# Altium integrated library Mastermind.IntLib: 985 symbols (part 3 of 6) (continued)
## MODULE-TMC5160-BOB
designator U?
This board was developed for applications and installations where space is premium and projects are made as permanent set ups. Small, available in 3.3 V and 5 V versions, powered by ATmega328P.; MP: Arduino Pro Mini; MF: Arduino; Price: None; Availability: Not in stock; Package: None; Value: *; SnapEDA_Link: https://www.snapeda.com/parts/Arduino%20Pro%20Mini/Arduino/view-part/?ref=snap; Check_prices: https://www.snapeda.com/parts/Arduino%20Pro%20Mini/Arduino/view-part/?ref=eda
footprint Module_tmc5160_bob
pins: 1 VCC_IO (power), 2 GND (power), 3 CSN-CFG3, 4 SCK_SFG2, 5 SDI_CFG1, 6 SDO_CFG0, 7 GND, 8 CLK, 9 DRV_ENN, 10 REFL_STEP, 11 REFR_DIR, 12 ENCN_DCO_CFG6, 13 ENCB_DGEN_CFG4, 14 ENCA_DCIN_CFG5, 15 DIAG0_SWN, 16 GND, 17 BMA1, 18 BMA2, 19 BMB1, 20 BMB2, 21 GND (power), 22 VS (power)

## MODULE-XL4015
designator U?
footprint MODULE-XL4015
pins: 1 IN, 2 GND, 3 OUT, 4 GND
text: XL4015-ADJ

## MOSFET-2N70002
designator Q?, comment 2N7002  (value not drawn)
N-Channel Mosfet 2N7002E - 60V 260mA SOT23
footprint SOT23
pins: 1 G "Gate", 2 S "Drain", 3 D "Source"

## MOSFET-AO3407_SOT23
designator Q?
footprint SOT23
pins: 1 G, 2 S, 3 D

## MOSFET-AO4884
designator U?, comment AO4884  (value not drawn)
Dual N-Channel 40V 10A  27mΩ  SOP8; Manufacturer: HXY MOSFET(华轩阳电子); Manufacturer Part: AO4884-HXY; Contributor: lcsc; Supplier: LCSC; Supplier Part: C5148656; JLCPCB Part Class: Extended Part; spicePre: U; spiceSymbolName: AO4884_C5148656
footprint SOIC-8E (SOIC, 8-Leads, Body 4.90x3.90mm, Pitch 1.27mm, IPC Medium Density); pin to pad 5>5+6 7>7+8
part A pins: 1 S "Drain", 2 G "Gate", 7 D "Source"
part B pins: 3 S "Drain", 4 G "Gate", 5 D "Source"

## MOSFET-AON7212
designator Q?, comment AON7212
N Channel Mosfet 30V 40A dfn-8
footprint POWERDI3333-8_L3.3-W3.3-P0.65-BL
pins: 1 G, 2 S, 3 D

## MOSFET-BSC886N03LSG
designator U1, comment BSC886N03LSG
Manufacturer: Infineon(英飞凌); Contributor: lcsc; Supplier: LCSC; Supplier Part: C3275891; Manufacturer Part: BSC886N03LSG; spicePre: U; spiceSymbolName: BSC886N03LSG
footprint PG-TDSON-8_L5.0-W6.0-P1.27-BL-EP
pins: 1 S, 2 S, 3 S, 4 G, 5 D, 6 D, 7 D, 8 D

## MOSFET-BSS138
designator Q?, comment BSS138
N Channel Mosfet
footprint SOT23
pins: 1 "Gate", 2 "Source", 3 "Drain"

## MOSFET-D403-PChannel
designator Q?
footprint TO252
pins: 1 G, 2 S, 3 D

## MOSFET-DMP2305u-7
designator Q?, comment DMP2305u-7
P Channel Mosfet
footprint SOT23
pins: 1 "Gate", 2 "Source", 3 "Drain"

## MOSFET-DMP4025SFG
designator Q?, comment DMP2305u-7
P Channel Mosfet
footprint POWERDI3333-8_L3.3-W3.3-P0.65-BL
pins: 1 G, 2 S, 3 D

## MOSFET-HYG200P10LR1B_P
designator Q?, comment HYG200P10LR1B
P-Channel MOSFET,  100V 80A Externally Terminated Substrate; Published: 24-Mar-1999; LatestRevisionDate: 29-May-2009; LatestRevisionNote: IPC-7351 Footprint Added.; PackageVersion: Sep-2000; PackageReference: SOT-343; Publisher: Altium Limited; PackageDescription: 4-Pin SOT-343 Package 1.3 mm Pitch, 2.1 mm Lead Span
footprint TO-263-2
pins: 1 G, 2 D, 3 S

## MOSFET-IPB072N15N3G
designator Q?, comment IPB072N15N3G
N-Channel MOSFET,  100V 80A  7.2mΩ; Published: 24-Mar-1999; LatestRevisionDate: 29-May-2009; LatestRevisionNote: IPC-7351 Footprint Added.; PackageVersion: Sep-2000; PackageReference: SOT-343; Publisher: Altium Limited; PackageDescription: 4-Pin SOT-343 Package 1.3 mm Pitch, 2.1 mm Lead Span
footprint TO-263-2
pins: 1 G, 2 D, 3 S

## MOSFET-IRF520
designator Q?, comment MOSFET-N4
N-Channel MOSFET; Published: 24-Mar-1999; LatestRevisionDate: 29-May-2009; LatestRevisionNote: IPC-7351 Footprint Added.; PackageVersion: Sep-2000; PackageReference: SOT-343; Publisher: Altium Limited; PackageDescription: 4-Pin SOT-343 Package 1.3 mm Pitch, 2.1 mm Lead Span
footprint TO220
pins: 1 G, 2 D, 3 S

## MOSFET-IRFP250PBF
designator Q?, comment IRFP250PBF
N-Channel; Manufacturer: VISHAY(威世); Add into BOM: yes; Drain Source On Resistance (RDS(on)@Vgs,Id): 85mΩ@10V,18A; Gate Threshold Voltage (Vgs(th)@Id): 4V@250uA; Total Gate Charge (Qg@Vgs): 140nC@10V; Input Capacitance (Ciss@Vds): 2.8nF@25V; Symbol: IRFP250PBF; Device: IRFP250PBF; Supplier: LCSC; Manufacturer Part: IRFP250PBF; Supplier Part: C11749; JLCPCB Part Class: Extended Part; LCSC Part Name: N沟道 耐压:200V 电流:30A; Supplier Footprint: TO-247AC-3; Datasheet: https://atta.szlcsc.com/upload/public/pdf/source/20130302/1457706596399.pdf; Convert to PCB: yes; Operating Temperature: -55℃~+150℃@(Tj); Name: IRFP250PBF
footprint TO-247AC-3_L15.8-W5.0-P5.46-L
pins: 1 G, 2 D, 3 S

## MOSFET-LR7807Z/15N10
designator Q?
P-
footprint TO252
footprint TO254P-3N
pins: 1 G, 2 D, 3 S

## MOSFET-MPT045N08S
designator Q?, comment MPT045N08S
N-Channel MOSFET,  85V 138A  4.4mΩ; Published: 24-Mar-1999; LatestRevisionDate: 29-May-2009; LatestRevisionNote: IPC-7351 Footprint Added.; PackageVersion: Sep-2000; PackageReference: SOT-343; Publisher: Altium Limited; PackageDescription: 4-Pin SOT-343 Package 1.3 mm Pitch, 2.1 mm Lead Span
footprint TO-263-2
pins: 1 G, 2 D, 3 S

## MOSFET-N
designator Q?, comment MOSFET-N4
N-Channel MOSFET; Published: 24-Mar-1999; LatestRevisionDate: 29-May-2009; LatestRevisionNote: IPC-7351 Footprint Added.; PackageVersion: Sep-2000; PackageReference: SOT-343; Publisher: Altium Limited; PackageDescription: 4-Pin SOT-343 Package 1.3 mm Pitch, 2.1 mm Lead Span
pins: 1 G, 1 G "Gate", 1 G, 1 G, 1 G "Gate", 2 D, 2 S "Drain", 2 S, 2 D, 2 S "Drain", 3 U, 3 D "Source", 3 D, 3 D "Source", 4 S, 4 S

## MOSFET-N4
designator Q?
N-Channel MOSFET, Externally Terminated Substrate; Published: 24-Mar-1999; LatestRevisionDate: 29-May-2009; LatestRevisionNote: IPC-7351 Footprint Added.; PackageVersion: Sep-2000; PackageReference: SOT-343; Publisher: Altium Limited; PackageDescription: 4-Pin SOT-343 Package 1.3 mm Pitch, 2.1 mm Lead Span
footprint SOT-343_N (SOT343, 4-Leads, Body 2x1.3 mm, Pitch 1.3mm, Lead Span 2.1mm, IPC Medium Density)
footprint SOT-343_L (SOT343, 4-Leads, Body 2x1.3 mm, Pitch 1.3mm, Lead Span 2.1mm, IPC High Density)
footprint SOT-343_M (SOT343, 4-Leads, Body 2x1.3 mm, Pitch 1.3mm, Lead Span 2.1mm, IPC Low Density)
simulation model NMOS (MOSFET-N)
pins: 1 G, 2 D, 3 U, 4 S

## MOSFET-NCE60P50K_P
designator Q?, comment NCE60P50K
P-Channel MOSFET,  60V 50A; Published: 24-Mar-1999; LatestRevisionDate: 29-May-2009; LatestRevisionNote: IPC-7351 Footprint Added.; PackageVersion: Sep-2000; PackageReference: SOT-343; Publisher: Altium Limited; PackageDescription: 4-Pin SOT-343 Package 1.3 mm Pitch, 2.1 mm Lead Span
footprint TO252
pins: 1 G, 2 S, 3 D

## MOSFET-NGDS_TO220V
designator Q?, comment N-Channel Mosfet 2N7002E - 60V 260mA SOT23 [Digikey: 2N7002ET1GOSTR-ND] - REEL  BSH103 - 30V 850mA SOT23 [Digikey: 568-5013-1-ND]
footprint TO220V
pins: 1 G, 2 D, 3 S

## MOSFET-NREFLOW
designator Q?, comment N-Channel Mosfet 2N7002E - 60V 260mA SOT23 [Digikey: 2N7002ET1GOSTR-ND] - REEL  BSH103 - 30V 850mA SOT23 [Digikey: 568-5013-1-ND]
footprint SOT23
pins: 1 G, 2 S, 3 D

## MOSFET-NTZD3152PT1G
designator Q?, comment NTZD3152PT1G
Dual P-Channel MOSFET 20V 1A; Manufacturer: TECH PUBLIC(台舟); Contributor: lcsc; Supplier: LCSC; Supplier Part: C7472928; Manufacturer Part: NTZD3152PT1G; spicePre: U; spiceSymbolName: NTZD3152PT1G_C7472928
footprint SOT-563_L1.6-W1.2-P0.50-LS1.6-BR
part A pins: 1 S, 2 G, 6 D
part B pins: 3 D, 4 S, 5 G

## MOSFET-NTZD3155CT1G
designator Q?, comment NTZD3155CT1G
N- and P-Channel MOSFET 20V; Manufacturer Name: ONSemi; Manufacturer Part No.: NTZD3155CT1G
footprint SOTFL50P160X60-6N
part A pins: 1 S, 2 G, 6 D
part B pins: 3 D, 4 S, 5 G

## MOSFET-NWAVE
designator Q?, comment N-Channel Mosfet 2N7002E - 60V 260mA SOT23 [Digikey: 2N7002ET1GOSTR-ND] - REEL  BSH103 - 30V 850mA SOT23 [Digikey: 568-5013-1-ND]
footprint SOT23-W
pins: 1 G, 2 S, 3 D

## MOSFET-P
designator Q?, comment DMP2305u-7
P Channel Mosfet
pins: 1 "Gate", 1 G, 1 G, 1 G, 2 "Source", 2 S, 2 D, 2 D, 3 "Drain", 3 D, 3 S, 4 S

## MOSFET-PGDS_TO220V
designator Q?
footprint TO220V
pins: 1 G, 2 D, 3 S

## MOSFET-SI2318CDS
designator Q?, comment SI2318CDS  (value not drawn)
N-Channel Mosfet- 40V 5.6A
footprint SOT23
pins: 1 G "Gate", 2 S "Drain", 3 D "Source"

## MOSFET-SI4554DY
designator Q?, comment Manufacturer Part No.: NTZD3155CT1G  (hidden comment: Verfiy PinS first)
N&P-Channel MOSFET 40V 8A; Manufacturer Name: ONSemi
footprint SOIC-8E (SOIC, 8-Leads, Body 4.90x3.90mm, Pitch 1.27mm, IPC Medium Density)
part A pins: 1 S, 2 G, 6 D
part B pins: 3 D, 4 S, 5 G

## MOSFET-SWB030R04VT
designator Q?, comment SWB030R04VT
N-Channel MOSFET,  40V 130A  2.8mΩ; Published: 24-Mar-1999; LatestRevisionDate: 29-May-2009; LatestRevisionNote: IPC-7351 Footprint Added.; PackageVersion: Sep-2000; PackageReference: SOT-343; Publisher: Altium Limited; PackageDescription: 4-Pin SOT-343 Package 1.3 mm Pitch, 2.1 mm Lead Span
footprint TO-263-2
pins: 1 G, 2 D, 3 S

## MOSFET-TPH3R704PL
designator Q?, comment TPH3R704PL
N Channel Mosfet 30V 40A dfn-8
footprint DSOP-8_L5.0-W5.0-P1.27-LS6.0-BL-EP
pins: 1 G, 2 S, 3 D

## MOSFET-TPH3R704PL_1
designator Q?, comment TPH3R704PL,L1Q
N Channel Mosfet 40V 92A dfn-8
footprint POWERDI3333-8_L3.3-W3.3-P0.65-BL
pins: 1 G, 2 S, 3 D

## MOSFETN-2N7002
designator Q?, comment 2N7002
N Channel Mosfet
footprint SOT23
pins: 1 "Gate", 2 "Source", 3 "Drain"

## MOSFETN-IRLR2905
designator U?, comment IRLR2905  (value not drawn)
55V 42A  27mΩ  TO-252
footprint TO252
pins: 1 G, 2 S, 3 D

## MOSFETN-WSD4066DN
designator U?, comment WSD4066DN  (value not drawn)
Dual Mosfet in one package
footprint DFN-8_L3.2-W3.1-P0.65-LS3.4-BL-EP; pin to pad 6>5+6 8>7+8
part A pins: 1 S1, 2 G1, 8 D1
part B pins: 3 S2, 4 G2, 6 D2

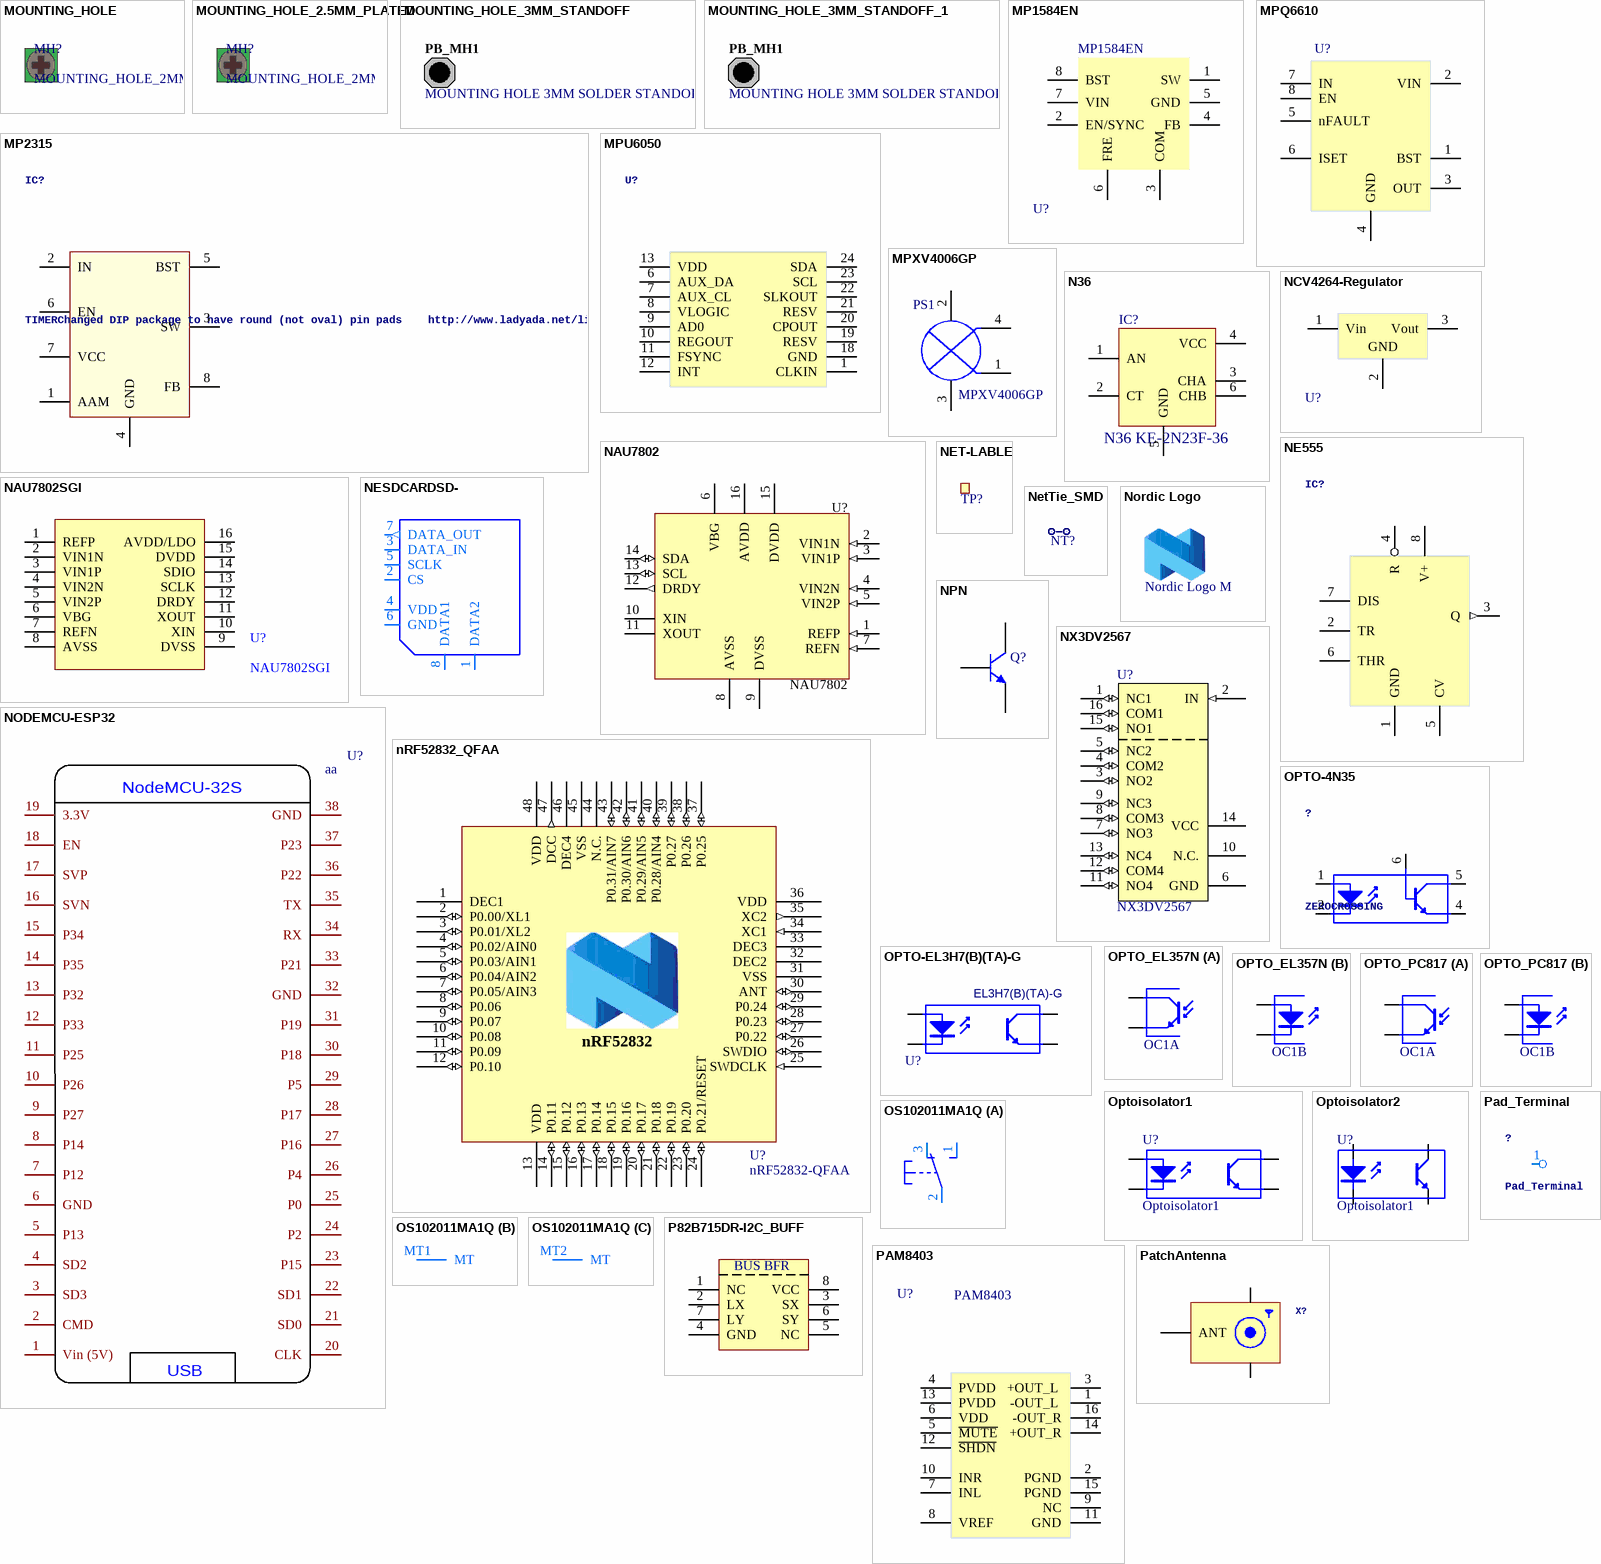
[diagram p19: symbols MOUNTING_HOLE to PatchAntenna]

## MOUNTING_HOLE
designator MH?, comment MOUNTING_HOLE_2MM
footprint MOUNTING_HOLE_2MM
footprint MOUNTING_HOLE_3.5mm
footprint MOUNTINGHOLE_2.5_PLATED
pins: MOUNT 3

## MOUNTING_HOLE_2.5MM_PLATED
designator MH?, comment MOUNTING_HOLE_2MM
footprint MOUNTINGHOLE_2.5_PLATED
pins: MOUNT 3

## MOUNTING_HOLE_3MM_STANDOFF
designator PB_MH1, comment MOUNTING HOLE 3MM SOLDER STANDOFF  (no BOM)
Mounting Hole for Solder Standoff, M3 Screw, Plated, Round Pad; Category: Mounting-Hole; Status: Production
footprint STANDOFF_SOLDER_3MM
pins: 1 hidden

## MOUNTING_HOLE_3MM_STANDOFF_1
designator PB_MH1, comment MOUNTING HOLE 3MM SOLDER STANDOFF  (no BOM)
Mounting Hole for Solder Standoff, M3 Screw, Plated, Round Pad; Category: Mounting-Hole; Status: Production
footprint STANDOFF_SOLDER_3MM
pins: 1 hidden

## MP1584EN
designator U?  Name: MP1584EN
footprint SOIC-8E _GND (SOIC, 8-Leads, Body 4.90x3.90mm, Pitch 1.27mm, IPC Medium Density); pin to pad 5>5+9
pins: 1 SW (power), 2 EN/SYNC, 3 COM, 4 FB (power), 5 GND, 6 FRE, 7 VIN, 8 BST

## MP2315
designator IC?, comment TIMERChanged DIP package to have round (not oval) pin pads    http://www.ladyada.net/library/pcb/eaglelibrary.html
footprint SOT23-8
pins: 1 AAM (power), 2 IN, 3 SW, 4 GND (power), 5 BST, 6 EN, 7 VCC, 8 FB

## MPQ6610
designator U?, comment MPQ6610  DC Motor Drivers  (value not drawn)
SOIC-8 Brushed DC Motor Drivers ROHS
footprint SOIC-8_L4.9-W3.9-P1.27-LS6.0-BL
footprint SOIC-8E (SOIC, 8-Leads, Body 4.90x3.90mm, Pitch 1.27mm, IPC Medium Density)
pins: 1 BST (power), 2 VIN, 3 OUT, 4 GND, 5 nFAULT, 6 ISET, 7 IN, 8 EN (power)

## MPU6050
designator U?
footprint MPU6050
pins: 1 CLKIN (power), 6 AUX_DA (power), 7 AUX_CL, 8 VLOGIC, 9 AD0, 10 REGOUT, 11 FSYNC, 12 INT, 13 VDD, 18 GND, 19 RESV, 20 CPOUT, 21 RESV, 22 SLKOUT, 23 SCL, 24 SDA

## MPXV4006GP
designator PS1
Pressure Sensor 0.87PSI _6kPa_ Vented Gauge Male - 0.13 _3.17mm_ Tube 0.2 V ~ 4.7 V 8-SMD, Gull Wing, Side Port; DETAILS: Board Mount Pressure Sensors SOP TOP PORT; MFG: NXP Semiconductors; MFGPN: MPXV4006GP; PACKAGE: TOP PORT; URL: https://www.mouser.co.uk/ProductDetail/NXP-Semiconductors/MPXV4006GP?qs=r8OyiFxb6RebIOUWIUZL2A%3D%3D
footprint SOP8-1369
pins: 1 OUT, 2 Vcc (power), 3 GND (power), 4 OUT

## N36
designator IC?, comment N36 KE-2N23F-36
Opto Encoder
footprint KE2N236
pins: 1 AN, 2 CT, 3 CHA, 4 VCC, 5 GND, 6 CHB

## NAU7802
designator U?
GateName_1: G$1; SymbolName_1: NAU7802; LibraryName: adafruit_sensor; DeviceSetName: NAU7802; NAU7802: NAU7802
footprint SOP-16_L9.9-W3.9-P1.27-LS6.0-BL
pins: 1 REFP (in), 2 VIN1N (in), 3 VIN1P (in), 4 VIN2N (in), 5 VIN2P (in), 6 VBG (power), 7 REFN (in), 8 AVSS (power), 9 DVSS (power), 10 XIN, 11 XOUT, 12 DRDY (out), 13 SCL (io), 14 SDA (io), 15 DVDD (power), 16 AVDD (power)

## NAU7802SGI
designator U?
Manufacturer: NUVOTON(新唐); Add into BOM: yes; Interface: I2C; number of channels: 2; Supply Voltage: 2.7V~5.5V; sampling frequency: 80Hz; resolution: 24Bit; Symbol: NAU7802SGI; Device: NAU7802SGI; Supplier: LCSC; Supplier Part: C2614351; Manufacturer Part: NAU7802SGI; JLCPCB Part Class: Extended Part; LCSC Part Name: NAU7802SGI; Supplier Footprint: SOP-16; Datasheet: https://atta.szlcsc.com/upload/public/pdf/source/20210417/C2614351_F0E6A78D6A0A2C65262CB499A8BCF368.pdf; Convert to PCB: yes; differential input: Yes; Operating Temperature: -40℃~+85℃
footprint SOP-16_L9.9-W3.9-P1.27-LS6.0-BL
pins: 1 REFP, 2 VIN1N, 3 VIN1P, 4 VIN2N, 5 VIN2P, 6 VBG, 7 REFN, 8 AVSS, 9 DVSS, 10 XIN, 11 XOUT, 12 DRDY, 13 SCLK, 14 SDIO, 15 DVDD, 16 AVDD/LDO

## NCV4264-Regulator
designator U?
footprint SOT223
pins: 1 Vin, 2 GND, 3 Vout

## NE555
designator IC?, comment TIMERChanged DIP package to have round (not oval) pin pads    http://www.ladyada.net/library/pcb/eaglelibrary.html  (value not drawn)
footprint DIL08-ROUND
pins: 1 GND (power), 2 TR, 3 Q (out), 4 R, 5 CV, 6 THR, 7 DIS, 8 V+ (power)

## NESDCARDSD-
designator ?
footprint SD-CARD
pins: 1 DATA2, 2 CS, 3 DATA_IN, 4 VDD (oe), 5 SCLK, 6 GND (oe), 7 DATA_OUT (out), 8 DATA1

## NET-LABLE
designator TP?, comment TP  (value not drawn)  (no BOM)
Testpoint, through hole; Part Number: Testpoint TH; Artikkelnr Noca: N.A.; Manufacturer: *; Manufacturer Part Number: *; Datasheet: *; Footprint Doc: TESTPAD-TH; LatestRevisionDate: 2009-12-12; Pin Count: 1; Publisher: Nordic Semiconductor; Published: 2009-12-12; Value: TP; Note: *; Supplier: *; Supplier part number: *; 2nd source Supplier: *; 2nd source part number: *; Artikkelnr Simpro: N.A.
pins: 1

## NetTie_SMD
designator NT?  (value not drawn)  (no BOM)
Jumper, 2-Pin
signal-integrity model Connector
footprint JUMPER-NT
pins: 1, 2

## NODEMCU-ESP32
designator U?, comment aa
footprint AI-THINKER_NODEMCU-32SLUA
pins: 1 Vin (5V), 2 CMD, 3 SD3, 4 SD2, 5 P13, 6 GND, 7 P12, 8 P14, 9 P27, 10 P26, 11 P25, 12 P33, 13 P32, 14 P35, 15 P34, 16 SVN, 17 SVP, 18 EN, 19 3.3V, 20 CLK, 21 SD0, 22 SD1, 23 P15, 24 P2, 25 P0, 26 P4, 27 P16, 28 P17, 29 P5, 30 P18, 31 P19, 32 GND, 33 P21, 34 RX, 35 TX, 36 P22, 37 P23, 38 GND
text: NodeMCU-32S; USB

## Nordic Logo
designator LOGO?, comment Nordic Logo M  (no BOM)
Nordic Logo, medium size; Artikkelnr Noca: N.A.; Part Number: Nordic Logo M; Manufacturer: *; Manufacturer Part Number: *; Datasheet: *; LatestRevisionDate: 2010-02-18; Publisher: Nordic Semiconductor; Value: Nordic Logo M; Note: *; Supplier: *; Supplier part number: *; 2nd source Supplier: *; 2nd source part number: *; Pin Count: 2; Published: 2010-02-18; Footprint Doc: NORDIC_LOGO_M; Artikkelnr Simpro: N.A.
footprint NORDIC_LOGO_M

## NPN
designator Q?
NPN Bipolar Transistor; Published: 8-Jun-2000; LatestRevisionDate: 17-Jul-2002; LatestRevisionNote: Re-released for DXP Platform.; PackageReference: TO-226-AA; Publisher: Altium Limited; PackageDescription: TO, Flat Index; 3 In-Line, Axial Leads; Body Dia. 4.8mm; Leads 0.55 x 0.51 mm (max); Code_JEDEC: TO-226-AA
simulation model NPN
signal-integrity model NPN
footprint SOT23
pins: 1 B, 2 E, 3 C

## nRF52832_QFAA
designator U?, comment nRF52832-QFAA
Multi-protocol Bluetooth Low Energy and 2.4GHz proprietary system-on-chip; Manufacturer: Nordic Semiconductor; Artikkelnr Noca: N.A.; Part Number: nRF52832-QFAA; Manufacturer Part Number: nRF52832-QFAA; Datasheet: *; LatestRevisionDate: 2014-11-26; Pin Count: 48; Publisher: Nordic Semiconductor; Published: 2014-11-26; Value: nRF52832-QFAA; Note: *; Supplier: Nordic Semiconductor; Supplier part number: *; 2nd source Supplier: *; 2nd source part number: *; Footprint Doc: QFN-48; Artikkelnr Simpro: N.A.
footprint QFN40P600X600X90-48N
pins: 1 DEC1 (power), 2 P0.00/XL1 (io), 3 P0.01/XL2 (io), 4 P0.02/AIN0 (io), 5 P0.03/AIN1 (io), 6 P0.04/AIN2 (io), 7 P0.05/AIN3 (io), 8 P0.06 (io), 9 P0.07 (io), 10 P0.08 (io), 11 P0.09 (io), 12 P0.10 (io), 13 VDD (power), 14 P0.11 (io), 15 P0.12 (io), 16 P0.13 (io), 17 P0.14 (io), 18 P0.15 (io), 19 P0.16 (io), 20 P0.17 (io), 21 P0.18 (io), 22 P0.19 (io), 23 P0.20 (io), 24 P0.21/RESET (io), 25 SWDCLK (in), 26 SWDIO (io), 27 P0.22 (io), 28 P0.23 (io), 29 P0.24 (io), 30 ANT (io), 31 VSS (power), 32 DEC2 (power), 33 DEC3 (power), 34 XC1 (in), 35 XC2 (out), 36 VDD (power), 37 P0.25 (io), 38 P0.26 (io), 39 P0.27 (io), 40 P0.28/AIN4 (io), 41 P0.29/AIN5 (io), 42 P0.30/AIN6 (io), 43 P0.31/AIN7 (io), 44 N.C. (power), 45 VSS (power), 46 DEC4 (power), 47 DCC (out), 48 VDD (power), 49 GND (power) hidden to GND
text: nRF52832

## NX3DV2567
designator U?
Low-ohmic four-pole double-throw analog switch; Part Number: NX3DV2567GU; Manufacturer: NXP Semiconductors; 2nd source part number: 771-NX3DV2567GU115; Artikkelnr Noca: N.A.; Manufacturer Part Number: NX3DV2567GU; Datasheet: http://www.nxp.com/documents/data_sheet/NX3DV2567.pdf; Footprint Doc: XQFN-16; LatestRevisionDate: 2015-02-17; Pin Count: 16; Publisher: Nordic Semiconductor; Published: 2015-02-17; Value: NX3DV2567; Note: *; Supplier: Digi-Key; Supplier part number: 568-5206-1-ND; 2nd source Supplier: Mouser; Artikkelnr Simpro: N.A.
footprint XQFN40P180X260X50-16N
pins: 1 NC1 (io), 2 IN (in), 3 NO2 (io), 4 COM2 (io), 5 NC2 (io), 6 GND (power), 7 NO3 (io), 8 COM3 (io), 9 NC3 (io), 10 N.C., 11 NO4 (io), 12 COM4 (io), 13 NC4 (io), 14 VCC (power), 15 NO1 (io), 16 COM1 (io)

## OPTO-4N35
designator ?, comment ZEROCROSSING
footprint DIL06F
pins: 1 A "Anode", 2 K "Cathode", 4 E "Emitter", 5 C "Collector", 6 B "Base"

## OPTO-EL3H7(B)(TA)-G
designator U?, comment EL3H7(B)(TA)-G
Photo transistor Optocoupler; Manufacturer: EVERLIGHT(亿光); Supplier: LCSC; Manufacturer Part: EL3H7(B)(TA)-G; Supplier Part: C32565; JLCPCB Part Class: Basic Part; spicePre: U; spiceSymbolName: EL3H7(B)(TA)-G
footprint SOP-4_L4.4-W2.8-P1.27-LS7.0-TL
pins: 1 A "Anode", 2 K "Cathode", 3 E "Emitter", 4 C "Collector"

## OPTO_EL357N
designator OC1, comment EL357N  (value not drawn)
OC_FARNELL: unknown; OC_NEWARK: unknown
footprint EL357N
part A pins: 3 E "Emitter", 4 C "Collector"
part B pins: 1 A "Anode", 2 K "Cathode"

## OPTO_PC817
designator OC1, comment EL357N  (value not drawn)
OC_FARNELL: unknown; OC_NEWARK: unknown
footprint OPTO-SMD-4_L4.6-W6.5-P2.54-LS10.3-BL
part A pins: 3 E "Emitter", 4 C "Collector"
part B pins: 1 A "Anode", 2 K "Cathode"

## Optoisolator1
designator U?
4-Pin Phototransistor Optocoupler; Published: 24-Mar-1999; LatestRevisionDate: 04-Mar-2005; LatestRevisionNote: Sch pins 3 & 4 Swapped.; DatasheetVersion: Nov-2003; PackageReference: DIP-4; Publisher: Altium Limited
footprint DIP-4
pins: 1 A "Anode", 2 K "Cathode", 3 E "Emitter", 4 C "Collector"

## Optoisolator2
designator U?, comment Optoisolator1
4-Pin Phototransistor Optocoupler; Published: 24-Mar-1999; LatestRevisionDate: 04-Mar-2005; LatestRevisionNote: Sch pins 3 & 4 Swapped.; DatasheetVersion: Nov-2003; PackageReference: DIP-4; Publisher: Altium Limited
footprint DIP-4
pins: 1 A "Anode", 2 K "Cathode", 3 E "Emitter", 4 C "Collector"

## OS102011MA1Q
designator SW?, comment OS10201MA1Q through-hole right angle switch    http://www.ladyada.net/library/eagle  (value not drawn)
footprint OS102011MA1Q
part A pins: 1 S, 2 P, 3 O
part B pins: MT1 MT
part C pins: MT2 MT

## P82B715DR-I2C_BUFF
designator U?, comment P82B715DR  (value not drawn)
I2C Bus Buffer; Manufacturer: TI(德州仪器); Add into BOM: yes; Input Type: 2-WireBus; Supply Voltage: 4.5V~12V; Number of Channels: 1; Input Capacitance: 3nF; Symbol: P82B715DR; Device: P82B715DR; LCSC Part Name: I2C Bus扩充器; Supplier Part: C2649394; Manufacturer Part: P82B715DR; Supplier Footprint: SOIC-8; JLCPCB Part Class: Extended Part; Datasheet: https://www.ti.com/cn/lit/gpn/p82b715; Supplier: LCSC; Convert to PCB: yes; Type: ；Buffers; Output Type: 2-WireBus; Operating Temperature: -40℃~+85℃; Application: I2C
footprint SOIC-8_L4.9-W3.9-P1.27-LS6.0-BL
footprint SOIC-8E (SOIC, 8-Leads, Body 4.90x3.90mm, Pitch 1.27mm, IPC Medium Density)
pins: 1 NC, 2 LX, 3 SX, 4 GND, 5 NC, 6 SY, 7 LY, 8 VCC
text: BUS BFR

## Pad_Terminal
designator ?
footprint PadCutOut_2.54mm
pins: 1

## PAM8403
designator U?
footprint SO-16
pins: 1 -OUT_L , 2 PGND, 3 +OUT_L , 4 PVDD, 5 ~{MUTE}, 6 VDD, 7 INL, 8 VREF, 9 NC, 10 INR, 11 GND, 12 ~{SHDN}, 13 PVDD, 14 +OUT_R, 15 PGND, 16 -OUT_R

## PatchAntenna
designator X?, comment SMA Connector   90Â° DIP SMA Connector, 50 Ohm (4UConnector: 07259)  (value not drawn)
footprint Patch_antenna
pins: 1 GND3 (power), 2 GND1 (power), 3 ANT
